# Altium footprint library ThanhNT.PcbLib: 579 footprints (part 15 of 37)
Each footprint in its own frame and in the unit in brackets; x right, y up, seen from the top. Pads: shape width x height; smd on the part's side, far side on the other; paste and mask are expansions set on the pad; w line width, h text height; cw(c..) or ccw(c..) is an arc to the next point about the centre after c.
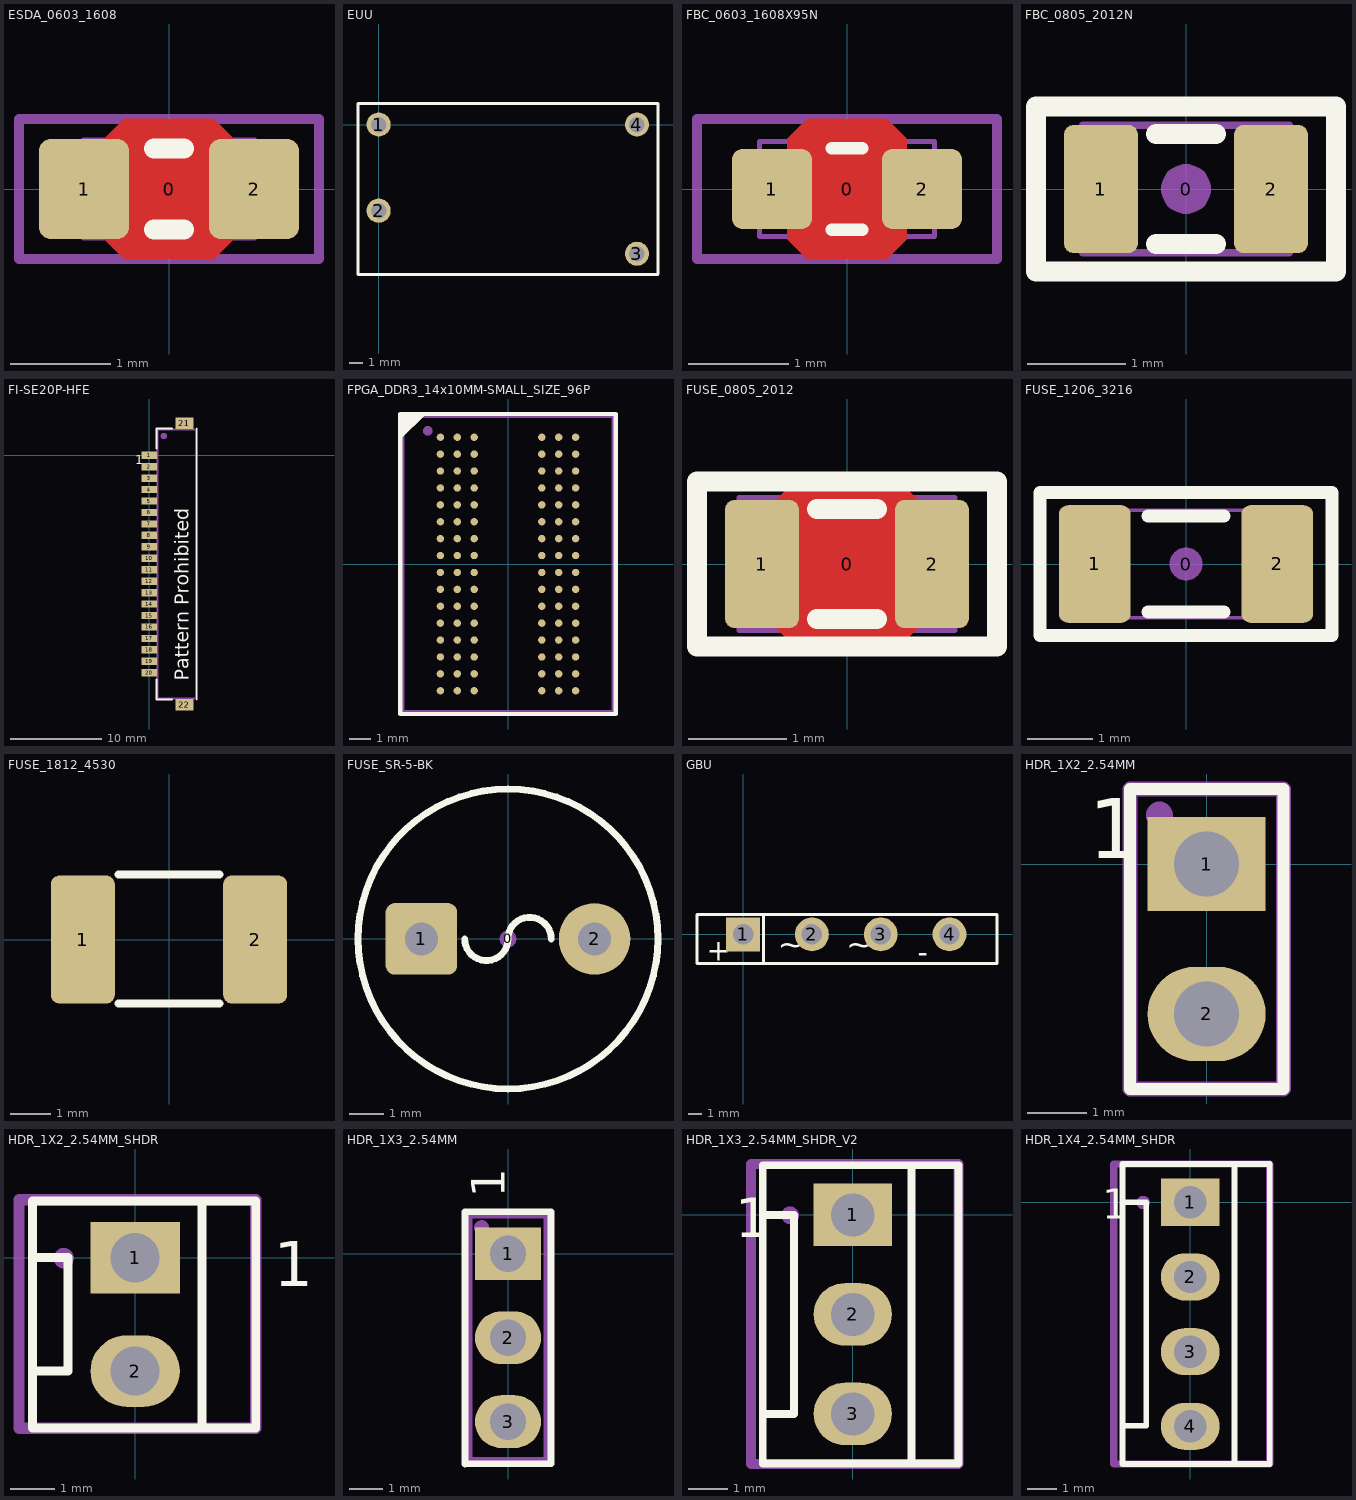
[diagram p14: the footprints below, top view; thin cyan lines are the x and y axes]

## ESDA_0603_1608 [mm] "Chip ESD suppressor, Body 1.6x0.8mm, 0603, IPC Medium Density"
height 0.8
pads (3):
  round 0.254 on Mech15: 0(0,0)
  rrect25% 0.9x1 smd: 1(-0.85,0) 2(0.85,0)
Top Layer:
  pour cut-out: -0.65,0.5 -0.45,0.7 0.45,0.7 0.65,0.5 0.65,-0.5 0.45,-0.7 -0.45,-0.7 -0.65,-0.5
Top Overlay:
  lines w0.2: -0.152,-0.406 0.152,-0.406 ; -0.152,0.406 0.152,0.406
Mechanical 13:
  lines w0.076: -0.85,-0.475 -0.85,0.475 0.85,0.475 0.85,-0.475 -0.85,-0.475
Mechanical 15:
  lines w0.1: -1.5,-0.7 -1.5,0.7 1.5,0.7 1.5,-0.7 -1.5,-0.7
Mechanical 16:
  rectangle: 0.336,-0.471 0.836,0.479
  rectangle: -0.832,-0.471 -0.332,0.479
  lines w0.102: -0.35,-0.42 0.362,-0.42 ; -0.35,0.431 0.362,0.431
3D body "ESD Suppressor 0603 SMD.STEP": height 0.79, standoff -0.01, extent -0.85,-0.45 0.85,0.45

## EUU [mil]
pads (4):
  round 70 hole 45: 1(0,0) 2(0,-250) 3(750,-375) 4(750,0)
Top Overlay:
  lines w7.87: -60,-435 810,-435 811,-434 811,61 -60,61 -60,-435

## FBC_0603_1608X95N [mm] "Chip Ferrite, Body 1.6x0.8mm, 0603, IPC Medium Density"
height 0.95
pads (3):
  round 0.254 on Mech15: 0(0,0)
  rrect25% 0.8x0.8 smd: 1(-0.75,0) 2(0.75,0)
Top Layer:
  pour cut-out: -0.6,0.5 -0.4,0.7 0.4,0.7 0.6,0.5 0.6,-0.5 0.4,-0.7 -0.4,-0.7 -0.6,-0.5
Top Overlay:
  lines w0.127: -0.152,-0.406 0.152,-0.406 ; -0.152,0.406 0.152,0.406
Mechanical 13:
  lines w0.05: -0.475,-0.475 -0.475,0.475 ; 0.475,-0.475 0.475,0.475 ; -0.875,-0.475 -0.875,0.475 0.875,0.475 0.875,-0.475 -0.875,-0.475
Mechanical 15:
  lines w0.1: -1.5,-0.7 1.5,-0.7 1.5,0.7 -1.5,0.7 -1.5,-0.7
3D body "FBC1608X95N.STEP": height 0.95, standoff 0, extent -0.875,-0.475 0.875,0.475

## FBC_0805_2012N [mm] "Ferrite Bead Chip, Body 2.0x1.2mm, 0805, IPC Medium Density"
height 0.9
pads (3):
  round 0.508 on Mech15: 0(0,0)
  rrect25% 0.75x1.3 smd: 1(-0.864,0) 2(0.864,0)
Top Overlay:
  lines w0.2: -0.305,-0.559 0.305,-0.559 ; -0.305,0.559 0.305,0.559 ; -1.524,-0.838 1.524,-0.838 1.524,0.838 -1.524,0.838 -1.524,-0.838
Mechanical 13:
  lines w0.076: -1.05,-0.65 -1.05,0.65 1.05,0.65 1.05,-0.65 -1.05,-0.65
Mechanical 15:
  lines w0.1: -1.524,-0.85 -1.524,0.85 1.524,0.85 1.524,-0.85 -1.524,-0.85
3D body "FBC_0805.stp": height 0.9, standoff 0, extent -1,-0.625 1,0.625

## FI-SE20P-HFE [mm]
pads (22):
  rect 1.7x0.8 smd: 1(0,0) 2(0,-1.25) 3(0,-2.5) 4(0,-3.75) 5(0,-5) 6(0,-6.25) 7(0,-7.5) 8(0,-8.75) 9(0,-10) 10(0,-11.25) 11(0,-12.5) 12(0,-13.75) 13(0,-15) 14(0,-16.25) 15(0,-17.5) 16(0,-18.75) 17(0,-20) 18(0,-21.25) 19(0,-22.5) 20(0,-23.75)
  rect 2x1.25 smd: 21(3.85,3.5) 22(3.85,-27.25)
Top Overlay:
  lines w0.2: 0.8,-24.45 0.8,-26.65 2.5,-26.65 ; 0.8,0.7 0.8,2.9 2.5,2.9 ; 5.2,-26.65 5.2,2.9
  text "Pattern Prohibited" at 4.3,-24.6 h1.52
  text "1" at -1.5,-1 h1.02
Mechanical 16:
  circle w0.5: c1.6,2.1 r0.1
  lines w0.2: 0.9,-26.55 5.1,-26.55 5.1,2.8 0.9,2.8 0.9,-26.55
3D body "K3D-FI-SE20P-HFE-R1.STEP": height 2.11, standoff 0, extent -0.25,-27.275 5.1,3.475

## FPGA_DDR3_14x10MM-SMALL_SIZE_96P [mm]
pads (96):
  round 0.35 smd mask+0.05: A1(-3.2,6) A2(-2.4,6) A3(-1.6,6) A7(1.6,6) A8(2.4,6) A9(3.2,6) B1(-3.2,5.2) B2(-2.4,5.2) B3(-1.6,5.2) B7(1.6,5.2) B8(2.4,5.2) B9(3.2,5.2) C1(-3.2,4.4) C2(-2.4,4.4) C3(-1.6,4.4) C7(1.6,4.4) C8(2.4,4.4) C9(3.2,4.4) D1(-3.2,3.6) D2(-2.4,3.6) D3(-1.6,3.6) D7(1.6,3.6) D8(2.4,3.6) D9(3.2,3.6) E1(-3.2,2.8) E2(-2.4,2.8) E3(-1.6,2.8) E7(1.6,2.8) E8(2.4,2.8) E9(3.2,2.8) F1(-3.2,2) F2(-2.4,2) F3(-1.6,2) F7(1.6,2) F8(2.4,2) F9(3.2,2) G1(-3.2,1.2) G2(-2.4,1.2) G3(-1.6,1.2) G7(1.6,1.2) G8(2.4,1.2) G9(3.2,1.2) H1(-3.2,0.4) H2(-2.4,0.4) H3(-1.6,0.4) H7(1.6,0.4) H8(2.4,0.4) H9(3.2,0.4) J1(-3.2,-0.4) J2(-2.4,-0.4) J3(-1.6,-0.4) J7(1.6,-0.4) J8(2.4,-0.4) J9(3.2,-0.4) K1(-3.2,-1.2) K2(-2.4,-1.2) K3(-1.6,-1.2) K7(1.6,-1.2) K8(2.4,-1.2) K9(3.2,-1.2) L1(-3.2,-2) L2(-2.4,-2) L3(-1.6,-2) L7(1.6,-2) L8(2.4,-2) L9(3.2,-2) M1(-3.2,-2.8) M2(-2.4,-2.8) M3(-1.6,-2.8) M7(1.6,-2.8) M8(2.4,-2.8) M9(3.2,-2.8) N1(-3.2,-3.6) N2(-2.4,-3.6) N3(-1.6,-3.6) N7(1.6,-3.6) N8(2.4,-3.6) N9(3.2,-3.6) P1(-3.2,-4.4) P2(-2.4,-4.4) P3(-1.6,-4.4) P7(1.6,-4.4) P8(2.4,-4.4) P9(3.2,-4.4) R1(-3.2,-5.2) R2(-2.4,-5.2) R3(-1.6,-5.2) R7(1.6,-5.2) R8(2.4,-5.2) R9(3.2,-5.2) T1(-3.2,-6) T2(-2.4,-6) T3(-1.6,-6) T7(1.6,-6) T8(2.4,-6) T9(3.2,-6)
Top Overlay:
  region: -5.025,7.025 -3.975,7.025 -5.025,5.975
  lines w0.2: -5.1,-7.1 -5.1,7.1 5.1,7.1 5.1,-7.1 -5.1,-7.1
Mechanical 16:
  circle w0.254: c-3.8,6.3 r0.1
  lines w0.2: -5,-7 5,-7 5,7 -5,7 -5,-7
3D body: height 1.2, standoff 0, extent -5,-7 5,7

## FUSE_0805_2012 [mm] "Fuse, Body 2.0x1.2mm, EIA 0805, IPC Medium Density"
height 0.7
pads (3):
  round 0.254 on Mech15: 0(0,0)
  rrect25% 0.75x1.3 smd: 1(-0.864,0) 2(0.864,0)
Top Layer:
  pour cut-out: -0.725,0.65 -0.525,0.85 0.525,0.85 0.725,0.65 0.725,-0.65 0.525,-0.85 -0.525,-0.85 -0.725,-0.65
Top Overlay:
  lines w0.2: -0.305,-0.559 0.305,-0.559 ; -0.305,0.559 0.305,0.559 ; -1.524,-0.838 -1.524,0.838 1.524,0.838 1.524,-0.838 -1.524,-0.838
Mechanical 13:
  lines w0.05: 0.6,-0.674 -0.6,-0.674 ; -0.6,-0.674 0.6,-0.674 ; -0.6,-0.675 -1.1,-0.675 -1.1,0.675 -0.6,0.675 -0.6,-0.675 ; 0.6,-0.675 1.1,-0.675 1.1,0.675 0.6,0.675 ; 0.6,-0.675 0.6,0.675 ; 0.6,0.674 -0.6,0.674 0.6,0.674
Mechanical 15:
  lines w0.1: -1.524,-0.85 1.524,-0.85 1.524,0.85 -1.524,0.85 -1.524,-0.85
3D body "User Library-TNPW.STEP": height 0.46, standoff 0.01, extent -1,-0.625 1,0.625

## FUSE_1206_3216 [mm] "Fuse SMD,  Body 3.2x1.6mm, EIA 1206, IPC Medium Density"
height 0.7
pads (3):
  round 0.508 on Mech15: 0(0,0)
  rrect25% 1.1x1.8 smd: 1(-1.397,0) 2(1.397,0)
Top Overlay:
  lines w0.2: -0.584,-0.737 0.584,-0.737 ; -0.584,0.737 0.584,0.737 ; -2.235,-1.092 2.235,-1.092 2.235,1.092 -2.235,1.092 -2.235,-1.092
Mechanical 13:
  lines w0.05: 1.025,-0.824 -1.025,-0.824 1.025,-0.824 ; -1.625,-0.825 -1.025,-0.825 -1.025,0.825 -1.625,0.825 -1.625,-0.825 ; -1.025,0.824 1.025,0.824 -1.025,0.824 ; 1.025,-0.825 1.025,0.825 1.625,0.825 1.625,-0.825 1.025,-0.825
Mechanical 15:
  lines w0.1: -2.235,-1.1 2.235,-1.1 2.235,1.1 -2.235,1.1 -2.235,-1.1
3D body "User Library-nona SMD075F.STEP": height 0.57, standoff 0.01, extent -1.601,-0.826 1.601,0.826

## FUSE_1812_4530 [mm] "Fuse SMD,  Body 4.5x3mm, EIA 1812, IPC Medium Density"
height 0.7
pads (2):
  rrect25% 1.6x3.2 smd: 1(-2.159,0) 2(2.159,0)
Top Overlay:
  lines w0.2: -1.27,-1.6 1.27,-1.6 ; -1.27,1.626 1.27,1.626
3D body "User Library-fuse1812.STEP": height 1.32, standoff 0, extent -2.41,-1.61 2.41,1.61

## FUSE_SR-5-BK [mm]
height 9.3
pads (3):
  round 0.5 on Mech15: 0(0,0)
  rrect25% 2.1x2.1 hole 0.965: 1(-2.54,0)
  round 2.1 hole 0.965: 2(2.54,0)
Top Overlay:
  circle w0.2: c0,0 r4.4
  lines w0.2: -1.27,0 ccw(c-0.635,0) 0,0 cw(c0.635,0) 1.27,0
Mechanical 13:
  circle w0.127: c0,-0.003 r4.4
3D body "Fuse_SR-5-BK.STEP": height 8.29, standoff -2.55, extent -4.35,-4.321 4.35,4.315

## GBU [mm]
pads (4):
  rect 2.5x2.5 hole 1.5: 1(0,0)
  round 2.5 hole 1.5: 2(5.08,0) 3(10.16,0) 4(15.24,0)
Top Overlay:
  lines w0.2: 1.499,-2.032 1.499,1.422 ; -3.404,-2.159 -3.404,1.473 18.745,1.473 18.745,-2.159 -3.404,-2.159
  text "+" at -2.692,-1.956 h1.52
  text "-" at 12.903,-2.057 h1.52
  text "~" at 2.54,-2.159 h3
  text "~" at 7.62,-2.159 h3
3D body "User Library-GBU.STEP": height 20.83, standoff -3.5, extent -3.53,-2.135 18.77,1.425

## HDR_1X2_2.54MM [mm]
pads (2):
  rect 2x1.6 hole 1.1: 1(0,0)
  oval 2x1.6 hole 1.1: 2(0,-2.54)
Top Overlay:
  lines w0.2: -1.3,-3.81 -1.3,1.27 1.3,1.27 1.3,-3.81 -1.3,-3.81
  text "1" at -2,0.1 h1.02
Mechanical 16:
  circle w0.254: c-0.8,0.83 r0.1
  lines w0.254: -1.3,-3.81 1.3,-3.81 1.3,1.27 -1.3,1.27 -1.3,-3.81
3D body "77311-118-02lf.stp": height 8.4, standoff -3.1, extent -1.205,-3.62 1.205,1.06

## HDR_1X2_2.54MM_SHDR [mm]
pads (2):
  rect 2x1.6 hole 1.1: 1(0,0)
  oval 2x1.6 hole 1.1: 2(0,-2.54)
Top Overlay:
  lines w0.2: -2.3,-2.54 -1.5,-2.54 -1.5,0 -2.3,0 ; 1.5,-3.8 1.5,1.27 ; -2.3,-3.81 2.7,-3.81 2.7,1.27 -2.3,1.27 -2.3,-3.81
  text "1" at 3.1,-0.64 h1.02
Mechanical 16:
  circle w0.254: c-1.6,-0.01 r0.1
  lines w0.254: -2.6,-3.82 2.7,-3.82 2.7,1.3 -2.6,1.3 -2.6,-3.82
3D body "76384-302LFc.stp": height 9.34, standoff -3.43, extent -2.6,-3.31 2.649,0.77

## HDR_1X3_2.54MM [mm]
pads (3):
  rect 2x1.6 hole 1.1: 1(0,0)
  oval 2x1.6 hole 1.1: 2(0,-2.54) 3(0,-5.08)
Top Overlay:
  lines w0.2: -1.3,-6.36 -1.3,1.27 1.3,1.27 1.3,-6.3 ; -1.3,-6.35 1.3,-6.35
  text "1" at -0.1,1.7 h1.02
Mechanical 16:
  circle w0.254: c-0.8,0.79 r0.1
  lines w0.254: -1.2,-6.27 -1.2,1.19 1.2,1.19 1.2,-6.27 -1.2,-6.27
3D body "77311-y18-03_asm.stp": height 8.4, standoff -3.1, extent -1.2,-6.15 1.21,1.07

## HDR_1X3_2.54MM_SHDR_V2 [mm]
pads (3):
  rect 2x1.6 hole 1.1: 1(0,0)
  oval 2x1.6 hole 1.1: 2(0,-2.54) 3(0,-5.08)
Top Overlay:
  lines w0.2: -2.3,-5.08 -1.5,-5.08 -1.5,0 -2.3,0 ; 1.5,-6.35 1.5,1.27 ; -2.3,-6.35 2.7,-6.35 2.7,1.27 -2.3,1.27 -2.3,-6.35
  text "1" at -2.994,-0.57 h1.02
Mechanical 16:
  circle w0.254: c-1.6,-0.01 r0.1
  lines w0.254: -2.6,-6.36 -2.6,1.3 2.7,1.3 2.7,-6.36 -2.6,-6.36
3D body "76384-303LFc.stp": height 9.34, standoff -3.43, extent -2.6,-5.85 2.649,0.77

## HDR_1X4_2.54MM_SHDR [mm]
pads (4):
  rect 2x1.6 hole 1.1: 1(0,0)
  oval 2x1.6 hole 1.1: 2(0,-2.54) 3(0,-5.08) 4(0,-7.62)
Top Overlay:
  lines w0.2: -2.3,-7.6 -1.5,-7.6 -1.5,0 -2.3,0 ; 1.5,-8.9 1.5,1.3 ; -2.3,-8.9 -2.3,1.3 2.7,1.3 2.7,-8.9 -2.3,-8.9
  text "1" at -2.994,-0.57 h1.02
Mechanical 16:
  circle w0.254: c-1.6,-0.01 r0.1
  lines w0.254: -2.6,-8.9 2.7,-8.9 2.7,1.3 -2.6,1.3 -2.6,-8.9
3D body "76384-304lf.stp": height 9.34, standoff -3.43, extent -2.6,-8.39 2.649,0.77